# Altium footprint library 元件1.PcbLib: 420 footprints (part 3 of 27)
Each footprint in its own frame and in the unit in brackets; x right, y up, seen from the top. Pads: shape width x height; smd on the part's side, far side on the other; paste and mask are expansions set on the pad; w line width, h text height; cw(c..) or ccw(c..) is an arc to the next point about the centre after c.
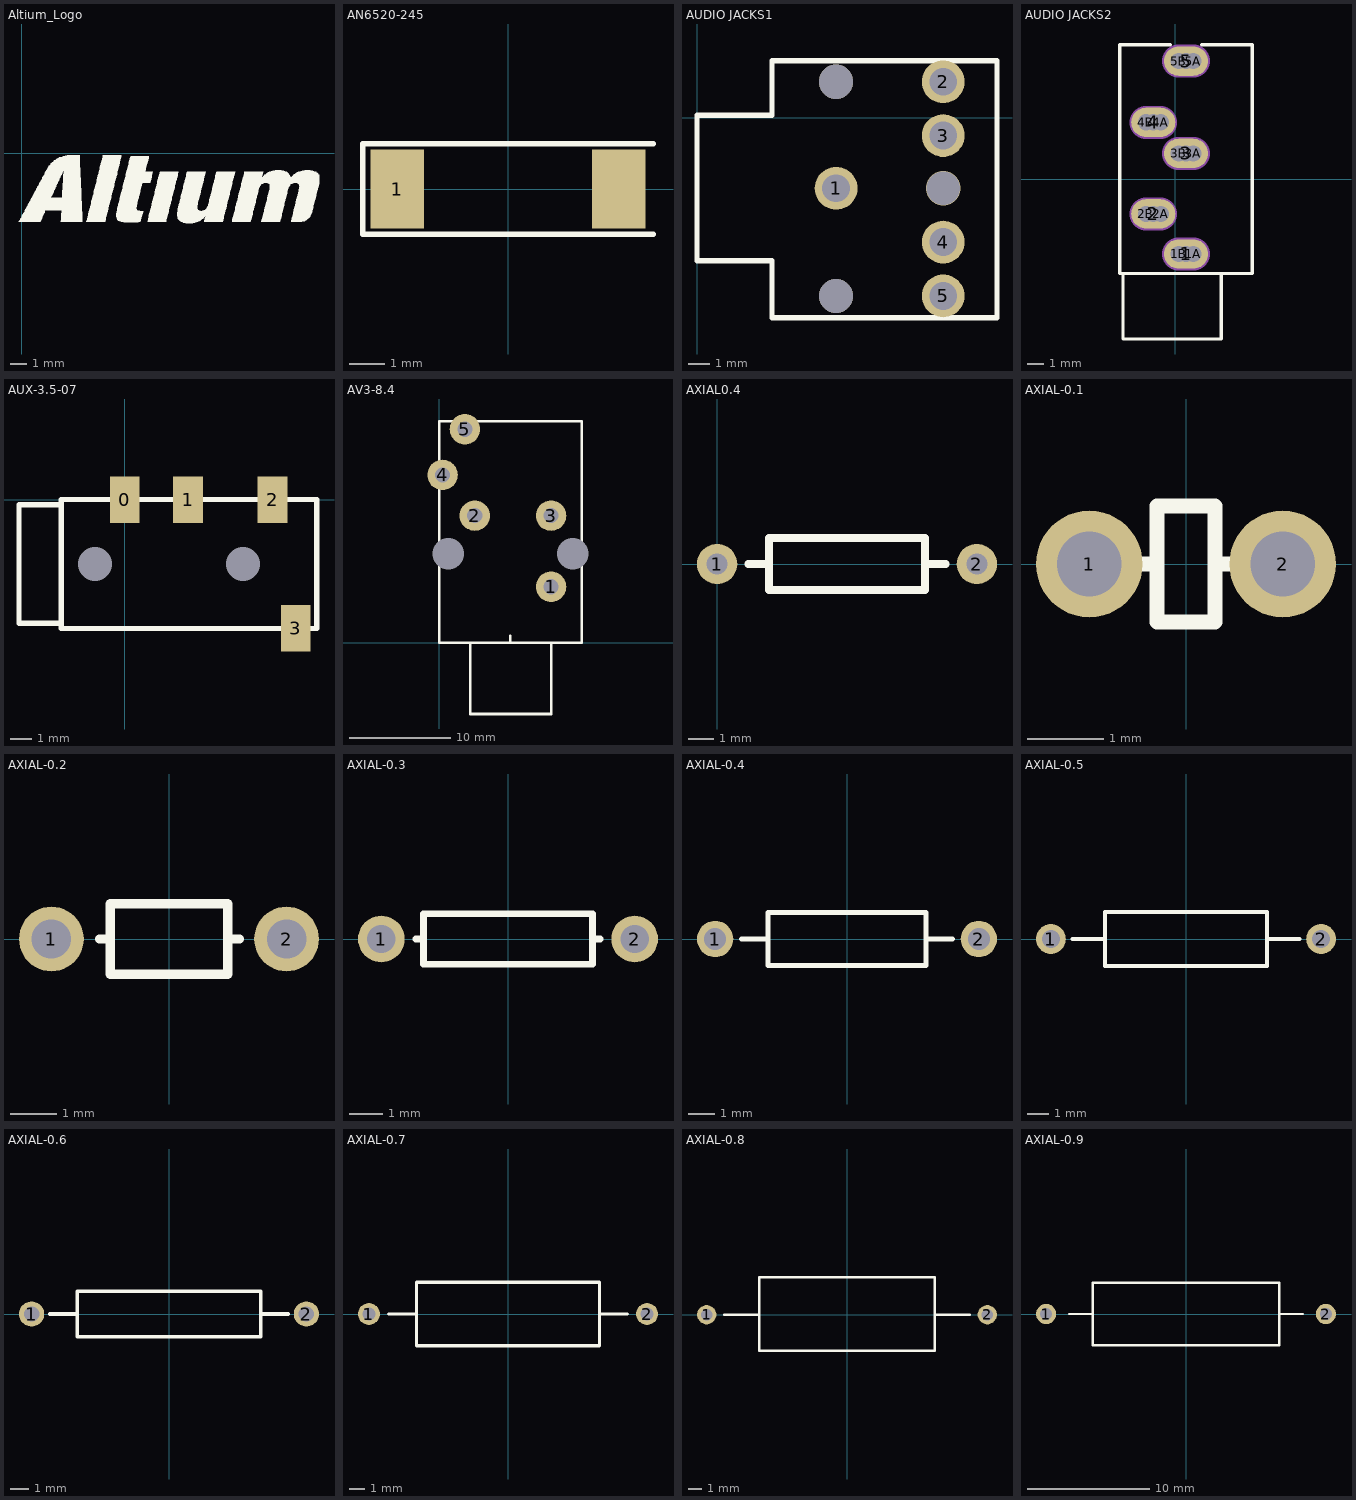
[diagram p2: the footprints below, top view; thin cyan lines are the x and y axes]

## Altium_Logo [mm]
Top Overlay:
  drawing of 1243 lines, arcs and shapes, not listed

## AN6520-245 [mm]
height 1.2
pads (2):
  rect 1.5x2.2 smd: 1(-3.1,0) ""(3.1,0)
Top Overlay:
  lines w0.152: 4.064,-1.27 -4.064,-1.27 -4.064,1.27 4.064,1.27
3D body "AN6520-245.STEP": height 1.2, standoff 0, extent -3.25,-1.092 3.25,1.108

## AUDIO JACKS1 [mm]
pads (5):
  round 2 hole 1.3: 1(6.502,-3.302) 2(11.506,1.676) 3(11.506,-0.838) 4(11.506,-5.817) 5(11.506,-8.331)
via 6.502,1.676 diameter 1.6 hole 1.6
via 6.502,-8.331 diameter 1.6 hole 1.6
via 11.506,-3.302 diameter 1.6 hole 1.56
Top Overlay:
  lines w0.254: 0,-6.68 3.505,-6.68 3.505,-9.347 14.021,-9.347 14.021,2.667 3.505,2.667 3.505,0.102 0,0.102 0,-6.68
3D body "sj1-3545n(AUDIO JACKS).stp": height 11.1, standoff -3.9, extent 0.011,-9.377 15.011,2.823

## AUDIO JACKS2 [mm]
pads (15):
  oval 2.7x1.8 hole 1: 1(0.672,-4.579) 2(-1.328,-2.129) 3(0.672,1.571) 4(-1.328,3.471) 5(0.672,7.221)
  round 1.2 hole 1: 1A(1.122,-4.579) 1B(0.222,-4.579) 2A(-0.878,-2.129) 2B(-1.778,-2.129) 3A(1.122,1.571) 3B(0.222,1.571) 4A(-0.878,3.471) 4B(-1.778,3.471) 5A(1.122,7.221) 5B(0.222,7.221)
Top Overlay:
  lines w0.2: -3.178,-5.779 -3.178,-9.779 2.822,-9.779 2.822,-5.779 ; -0.278,8.221 -3.378,8.221 -3.378,-5.779 4.722,-5.779 4.722,8.221 1.622,8.221
Mechanical 2:
  lines w2.016: -1.778,-2.129 -0.878,-2.129 ; -1.778,3.471 -0.878,3.471 ; 0.222,-4.579 1.122,-4.579 ; 0.222,1.571 1.122,1.571 ; 0.222,7.221 1.122,7.221
3D body "AUDIO JACK.stp": height 5.3, standoff -10.3, extent -3.478,-9.779 4.722,8.221

## AUX-3.5-07 [mm]
pads (6):
  rect 1.4x2.2 smd: 0(-0.012,0) 1(2.988,0) 2(6.988,0) 3(8.088,-6.1)
  round 1 hole 1.6: ""(-1.412,-3.05) ""(5.588,-3.05)
Top Overlay:
  lines w0.254: -3.012,-5.85 -5.012,-5.85 -5.012,-0.25 -3.012,-0.25 ; -3.012,-5.85 -3.012,-0.25 ; -3.012,-5.85 -3.012,-6.1 9.088,-6.1 9.088,0 -3.012,0 -3.012,-0.25
3D body "SW3dPS-audio_buchse.STEP": height 4.06, standoff -0.01, extent -4.178,-6.507 7.792,0.827

## AV3-8.4 [mm]
pads (7):
  round 3 hole 1.5: 1(11,5.5) 2(3.5,12.5) 3(11,12.5) 4(0.325,16.5) 5(2.525,21)
  round 3 hole 3.1 unplated: ""(0.9,8.75) ""(13.15,8.75)
Top Overlay:
  lines w0.254: 3.04,0 3.04,-7.02 11.02,-7.02 11.02,0 ; 7,0 7,0.66 ; 0,0 0,21.8 14,21.8 14,0 0,0
3D body "User Library-Mouser_161-4320.STEP": height 40.92, standoff -4.32, extent 0.3,-8.208 17.115,23.008

## AXIAL0.4 [mil] "此模型引用\"王千会\"作品，特此声明"
height 47.24
pads (2):
  round 62 hole 32: 1(0,0) 2(400,0)
Top Overlay:
  lines w12: 48,0 80,0 ; 320,0 352,0 ; 80,-40 80,40 320,40 320,-40 80,-40
3D body "SW3dPS-AXIAL_RESISTOR(0.25W).STEP": height 101.42, standoff -60, extent -12.6,-47.24 412.6,47.24

## AXIAL-0.1 [mm] "Axial Device, Resistor , Thru-Hole; 2 Leads; 0.1 in Pin Spacing"
height 1.524
pads (2):
  round 1.4 hole 0.85: 1(-1.27,0) 2(1.27,0)
Top Overlay:
  lines w0.2: -0.635,0 -0.406,0 ; 0.762,0 0.381,0 ; 0.381,0 0.381,0.762 -0.381,0.762 -0.381,-0.762 0.381,-0.762 0.381,0
3D body "SW3dPS-Res_Stand.STEP": height 6.85, standoff -1.9, extent -2.188,-0.952 1.524,0.889

## AXIAL-0.2 [mm] "Axial Device, Resistor , Thru-Hole; 2 Leads; 0.3 in Pin Spacing"
height 1.524
pads (2):
  round 1.4 hole 0.85: 1(-2.54,0) 2(2.54,0)
Top Overlay:
  lines w0.2: -1.499,0 -1.27,0 ; 1.524,0 1.27,0 ; 1.27,0 1.27,0.762 -1.27,0.762 -1.27,-0.762 1.27,-0.762 1.27,0
3D body "AXIAL-0.2-0.125W.STEP": height 2.91, standoff -2, extent -2.794,-0.889 2.736,0.931

## AXIAL-0.3 [mm] "1/8W"
height 1.524
pads (2):
  round 1.4 hole 0.85: 1(-3.81,0) 2(3.81,0)
Top Overlay:
  lines w0.2: -2.769,0 -2.54,0 ; 2.769,0 2.54,0 ; 2.54,0 2.54,-0.762 -2.54,-0.762 -2.54,0.762 2.54,0.762 2.54,0
3D body "User Library-Resistencia-1.STEP": height 2.36, standoff -1.15, extent -4.064,-0.971 4.064,0.971

## AXIAL-0.4 [mm] "1/4W/1/2W"
height 2.032
pads (2):
  round 1.4 hole 0.85: 1(-5.08,0) 2(5.08,0)
Top Overlay:
  lines w0.2: -4.064,0 -3.048,0 ; 3.048,0 4.064,0 ; -3.048,-1.016 3.048,-1.016 3.048,1.016 -3.048,1.016 -3.048,-1.016
3D body "AXIAL-0.4-0.25W.STEP": height 3.26, standoff -2, extent -5.38,-1.26 5.38,1.26

## AXIAL-0.5 [mm] "1/2W/1W"
height 2.54
pads (2):
  round 1.4 hole 0.85: 1(-6.35,0) 2(6.35,0)
Top Overlay:
  lines w0.2: -5.334,0 -3.81,0 ; 3.81,0 5.334,0 ; -3.81,-1.27 3.81,-1.27 3.81,1.27 -3.81,1.27 -3.81,-1.27
3D body "User Library-Resistencia 0_5.STEP": height 3.1, standoff -1.5, extent -6.731,-1.461 6.731,1.397

## AXIAL-0.6 [mm] "Variable Resistor; 2 Leads"
height 2.54
pads (2):
  round 1.4 hole 0.85: 1(-7.62,0) 2(7.62,0)
Top Overlay:
  lines w0.2: -6.604,0 -5.08,0 ; 5.08,0 6.604,0 ; -5.08,-1.27 -5.08,1.27 5.08,1.27 5.08,-1.27 -5.08,-1.27
3D body "AXIAL06.STEP": height 2.5, standoff -0.8, extent -7.737,-1.351 7.823,1.249

## AXIAL-0.7 [mm] "Variable Resistor; 2 Leads"
height 4.064
pads (2):
  round 1.4 hole 0.85: 1(-8.89,0) 2(8.89,0)
Top Overlay:
  lines w0.2: -7.62,0 -5.842,0 ; 5.842,0 7.62,0 ; -5.842,-2.032 5.842,-2.032 5.842,2.032 -5.842,2.032 -5.842,-2.032
3D body "AXIAL07.STEP": height 4.3, standoff -1, extent -9.214,-2.413 9.246,2.187

## AXIAL-0.8 [mm] "2W"
height 4.064
pads (2):
  round 1.4 hole 0.85: 1(-10.16,0) 2(10.16,0)
Top Overlay:
  lines w0.2: -8.89,0 -6.35,0 ; 6.35,0 8.89,0 ; -6.35,-2.616 6.35,-2.616 6.35,2.718 -6.35,2.718 -6.35,-2.616
3D body "RES-2W.STEP": height 5.5, standoff -3, extent -10.485,-2.655 10.535,2.845

## AXIAL-0.9 [mm] "Magnetic-Core Inductor; 2 Leads"
height 5.08
pads (2):
  round 1.65 hole 1: 1(-11.43,0) 2(11.43,0)
Top Overlay:
  lines w0.2: -9.525,0 -7.62,0 ; 7.62,0 9.525,0 ; -7.62,-2.54 -7.62,2.54 7.62,2.54 7.62,-2.54 -7.62,-2.54
3D body "AXIAL09.STEP": height 4.3, standoff -1, extent -11.889,-2.362 11.811,2.238